# Altium footprint library 3.22-杂项.PcbLib: 985 footprints (part 22 of 64)
Each footprint in its own frame and in the unit in brackets; x right, y up, seen from the top. Pads: shape width x height; smd on the part's side, far side on the other; paste and mask are expansions set on the pad; w line width, h text height; cw(c..) or ccw(c..) is an arc to the next point about the centre after c.
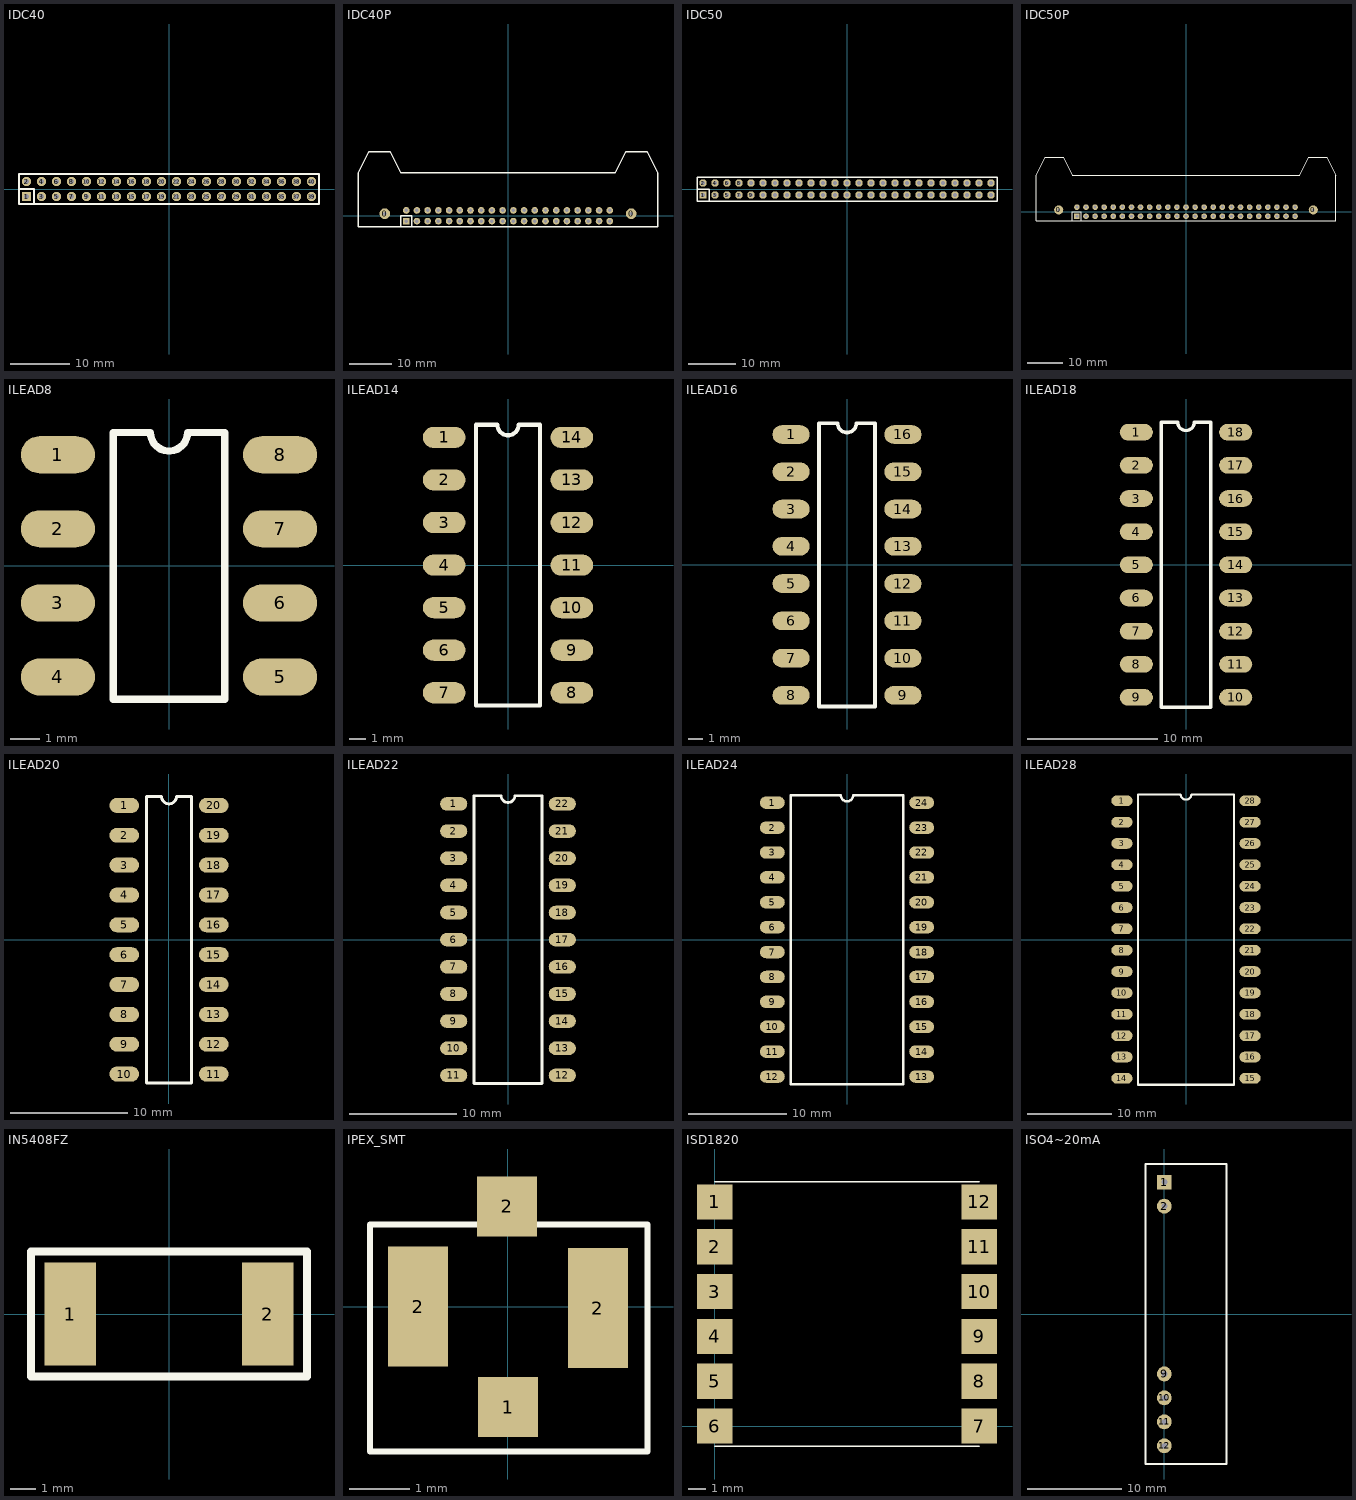
[diagram p21: the footprints below, top view; thin cyan lines are the x and y axes]

## IDC40 [mil]
pads (40):
  rect 62x62 hole 32: 1(-950,-50)
  round 62 hole 32: 2(-950,50) 3(-850,-50) 4(-850,50) 5(-750,-50) 6(-750,50) 7(-650,-50) 8(-650,50) 9(-550,-50) 10(-550,50) 11(-450,-50) 12(-450,50) 13(-350,-50) 14(-350,50) 15(-250,-50) 16(-250,50) 17(-150,-50) 18(-150,50) 19(-50,-50) 20(-50,50) 21(50,-50) 22(50,50) 23(150,-50) 24(150,50) 25(250,-50) 26(250,50) 27(350,-50) 28(350,50) 29(450,-50) 30(450,50) 31(550,-50) 32(550,50) 33(650,-50) 34(650,50) 35(750,-50) 36(750,50) 37(850,-50) 38(850,50) 39(950,-50) 40(950,50)
Top Overlay:
  lines w12: -1000,0 -900,0 -900,-100 ; -1000,-100 1000,-100 1000,100 -1000,100 -1000,-100

## IDC40P [mil]
pads (42):
  round 100 hole 32: 0(-1150,20) 0(1150,20)
  rect 62x62 hole 32: 1(-950,-50)
  round 62 hole 32: 2(-950,50) 3(-850,-50) 4(-850,50) 5(-750,-50) 6(-750,50) 7(-650,-50) 8(-650,50) 9(-550,-50) 10(-550,50) 11(-450,-50) 12(-450,50) 13(-350,-50) 14(-350,50) 15(-250,-50) 16(-250,50) 17(-150,-50) 18(-150,50) 19(-50,-50) 20(-50,50) 21(50,-50) 22(50,50) 23(150,-50) 24(150,50) 25(250,-50) 26(250,50) 27(350,-50) 28(350,50) 29(450,-50) 30(450,50) 31(550,-50) 32(550,50) 33(650,-50) 34(650,50) 35(750,-50) 36(750,50) 37(850,-50) 38(850,50) 39(950,-50) 40(950,50)
Top Overlay:
  lines w12: -1000,-100 -1000,0 -900,0 -900,-100 ; -1400,-100 1400,-100 1400,400 1300,600 1100,600 1000,400 -1000,400 -1100,600 -1300,600 -1400,400 -1400,-100

## IDC50 [mil]
pads (50):
  rect 62x62 hole 32: 1(-1200,-50)
  round 62 hole 32: 2(-1200,50) 3(-1100,-50) 4(-1100,50) 5(-1000,-50) 6(-1000,50) 7(-900,-50) 8(-900,50) 9(-800,-50) 10(-800,50) 11(-700,-50) 12(-700,50) 13(-600,-50) 14(-600,50) 15(-500,-50) 16(-500,50) 17(-400,-50) 18(-400,50) 19(-300,-50) 20(-300,50) 21(-200,-50) 22(-200,50) 23(-100,-50) 24(-100,50) 25(0,-50) 26(0,50) 27(100,-50) 28(100,50) 29(200,-50) 30(200,50) 31(300,-50) 32(300,50) 33(400,-50) 34(400,50) 35(500,-50) 36(500,50) 37(600,-50) 38(600,50) 39(700,-50) 40(700,50) 41(800,-50) 42(800,50) 43(900,-50) 44(900,50) 45(1000,-50) 46(1000,50) 47(1100,-50) 48(1100,50) 49(1200,-50) 50(1200,50)
Top Overlay:
  lines w12: -1250,0 -1150,0 -1150,-100 ; -1250,-100 1250,-100 1250,100 -1250,100 -1250,-100

## IDC50P [mil]
pads (52):
  round 100 hole 32: 0(-1400,20) 0(1400,20)
  rect 62x62 hole 32: 1(-1200,-50)
  round 62 hole 32: 2(-1200,50) 3(-1100,-50) 4(-1100,50) 5(-1000,-50) 6(-1000,50) 7(-900,-50) 8(-900,50) 9(-800,-50) 10(-800,50) 11(-700,-50) 12(-700,50) 13(-600,-50) 14(-600,50) 15(-500,-50) 16(-500,50) 17(-400,-50) 18(-400,50) 19(-300,-50) 20(-300,50) 21(-200,-50) 22(-200,50) 23(-100,-50) 24(-100,50) 25(0,-50) 26(0,50) 27(100,-50) 28(100,50) 29(200,-50) 30(200,50) 31(300,-50) 32(300,50) 33(400,-50) 34(400,50) 35(500,-50) 36(500,50) 37(600,-50) 38(600,50) 39(700,-50) 40(700,50) 41(800,-50) 42(800,50) 43(900,-50) 44(900,50) 45(1000,-50) 46(1000,50) 47(1100,-50) 48(1100,50) 49(1200,-50) 50(1200,50)
Top Overlay:
  lines w12: -1250,-100 -1250,0 -1150,0 -1150,-100 ; -1650,-100 -1650,400 -1550,600 -1350,600 -1250,400 1250,400 1350,600 1550,600 1650,400 1650,-100 -1650,-100

## ILEAD8 [mil]
pads (8):
  oval 100x50 smd: 1(-150,150) 2(-150,50) 3(-150,-50) 4(-150,-150) 5(150,-150) 6(150,-50) 7(150,50) 8(150,150)
Top Overlay:
  lines w10: -75,-180 75,-180 75,180 25,180 cw(c0,180) -25,180 -75,180 -75,-180

## ILEAD14 [mil]
pads (14):
  oval 100x50 smd: 1(-150,300) 2(-150,200) 3(-150,100) 4(-150,0) 5(-150,-100) 6(-150,-200) 7(-150,-300) 8(150,-300) 9(150,-200) 10(150,-100) 11(150,0) 12(150,100) 13(150,200) 14(150,300)
Top Overlay:
  lines w10: -75,-330 75,-330 75,330 25,330 cw(c0,330) -25,330 -75,330 -75,-330

## ILEAD16 [mil]
pads (16):
  oval 100x50 smd: 1(-150,350) 2(-150,250) 3(-150,150) 4(-150,50) 5(-150,-50) 6(-150,-150) 7(-150,-250) 8(-150,-350) 9(150,-350) 10(150,-250) 11(150,-150) 12(150,-50) 13(150,50) 14(150,150) 15(150,250) 16(150,350)
Top Overlay:
  lines w10: -75,-380 -75,380 -25,380 ccw(c0,380) 25,380 75,380 75,-380 -75,-380

## ILEAD18 [mil]
pads (18):
  oval 100x50 smd: 1(-150,400) 2(-150,300) 3(-150,200) 4(-150,100) 5(-150,0) 6(-150,-100) 7(-150,-200) 8(-150,-300) 9(-150,-400) 10(150,-400) 11(150,-300) 12(150,-200) 13(150,-100) 14(150,0) 15(150,100) 16(150,200) 17(150,300) 18(150,400)
Top Overlay:
  lines w10: -75,-430 75,-430 75,430 25,430 cw(c0,430) -25,430 -75,430 -75,-430

## ILEAD20 [mil]
pads (20):
  oval 100x50 smd: 1(-150,450) 2(-150,350) 3(-150,250) 4(-150,150) 5(-150,50) 6(-150,-50) 7(-150,-150) 8(-150,-250) 9(-150,-350) 10(-150,-450) 11(150,-450) 12(150,-350) 13(150,-250) 14(150,-150) 15(150,-50) 16(150,50) 17(150,150) 18(150,250) 19(150,350) 20(150,450)
Top Overlay:
  lines w10: -75,-480 75,-480 75,480 25,480 cw(c0,480) -25,480 -75,480 -75,-480

## ILEAD22 [mil]
pads (22):
  oval 100x50 smd: 1(-200,500) 2(-200,400) 3(-200,300) 4(-200,200) 5(-200,100) 6(-200,0) 7(-200,-100) 8(-200,-200) 9(-200,-300) 10(-200,-400) 11(-200,-500) 12(200,-500) 13(200,-400) 14(200,-300) 15(200,-200) 16(200,-100) 17(200,0) 18(200,100) 19(200,200) 20(200,300) 21(200,400) 22(200,500)
Top Overlay:
  lines w10: -125,-530 125,-530 125,530 25,530 cw(c0,530) -25,530 -125,530 -125,-530

## ILEAD24 [mil]
pads (24):
  oval 100x50 smd: 1(-300,550) 2(-300,450) 3(-300,350) 4(-300,250) 5(-300,150) 6(-300,50) 7(-300,-50) 8(-300,-150) 9(-300,-250) 10(-300,-350) 11(-300,-450) 12(-300,-550) 13(300,-550) 14(300,-450) 15(300,-350) 16(300,-250) 17(300,-150) 18(300,-50) 19(300,50) 20(300,150) 21(300,250) 22(300,350) 23(300,450) 24(300,550)
Top Overlay:
  lines w10: -225,-580 -225,580 -25,580 ccw(c0,580) 25,580 225,580 225,-580 -225,-580

## ILEAD28 [mil]
pads (28):
  oval 100x50 smd: 1(-300,650) 2(-300,550) 3(-300,450) 4(-300,350) 5(-300,250) 6(-300,150) 7(-300,50) 8(-300,-50) 9(-300,-150) 10(-300,-250) 11(-300,-350) 12(-300,-450) 13(-300,-550) 14(-300,-650) 15(300,-650) 16(300,-550) 17(300,-450) 18(300,-350) 19(300,-250) 20(300,-150) 21(300,-50) 22(300,50) 23(300,150) 24(300,250) 25(300,350) 26(300,450) 27(300,550) 28(300,650)
Top Overlay:
  lines w10: -225,-680 -225,680 -25,680 ccw(c0,680) 25,680 225,680 225,-680 -225,-680

## IN5408FZ [mil]
pads (2):
  rect 78x156 smd: 1(-150,0) 2(150,0)
Top Overlay:
  lines w12: -210,-95 -210,95 210,95 210,-95 -210,-95

## IPEX_SMT [mm]
pads (4):
  rect 1x1 smd: 1(0,-1.673) 2(-0.014,1.673)
  rect 1x2 smd: 2(-1.5,0.002) 2(1.5,-0.023)
Top Overlay:
  lines w0.1: -2.3,-2.417 -2.3,1.368 2.323,1.368 2.323,-2.417 -2.3,-2.417

## ISD1820 [mm]
pads (12):
  rect 2x2 smd: 1(0,12.7) 2(0,10.16) 3(0,7.62) 4(0,5.08) 5(0,2.54) 6(0,0) 7(15,0) 8(15,2.54) 9(15,5.08) 10(15,7.62) 11(15,10.16) 12(15,12.7)
Top Overlay:
  lines w0.1: 0,-1.143 14.986,-1.143 ; 0,13.843 14.986,13.843 ; 13.948,-1.143 14.075,-1.143

## ISO4~20mA [mil] "隔离传感器4~20mA信号"
pads (6):
  rect 62x62 hole 25: 1(0,550)
  round 62 hole 25: 2(0,450) 9(0,-250) 10(0,-350) 11(0,-450) 12(0,-550)
Top Overlay:
  lines w7.99: -78.74,-625.98 -78.74,625.98 259.84,625.98 259.84,-625.98 -78.74,-625.98